# Altium footprint library JDR2812（公开）.PcbLib: 142 footprints (part 5 of 9)
Each footprint in its own frame and in the unit in brackets; x right, y up, seen from the top. Pads: shape width x height; smd on the part's side, far side on the other; paste and mask are expansions set on the pad; w line width, h text height; cw(c..) or ccw(c..) is an arc to the next point about the centre after c.
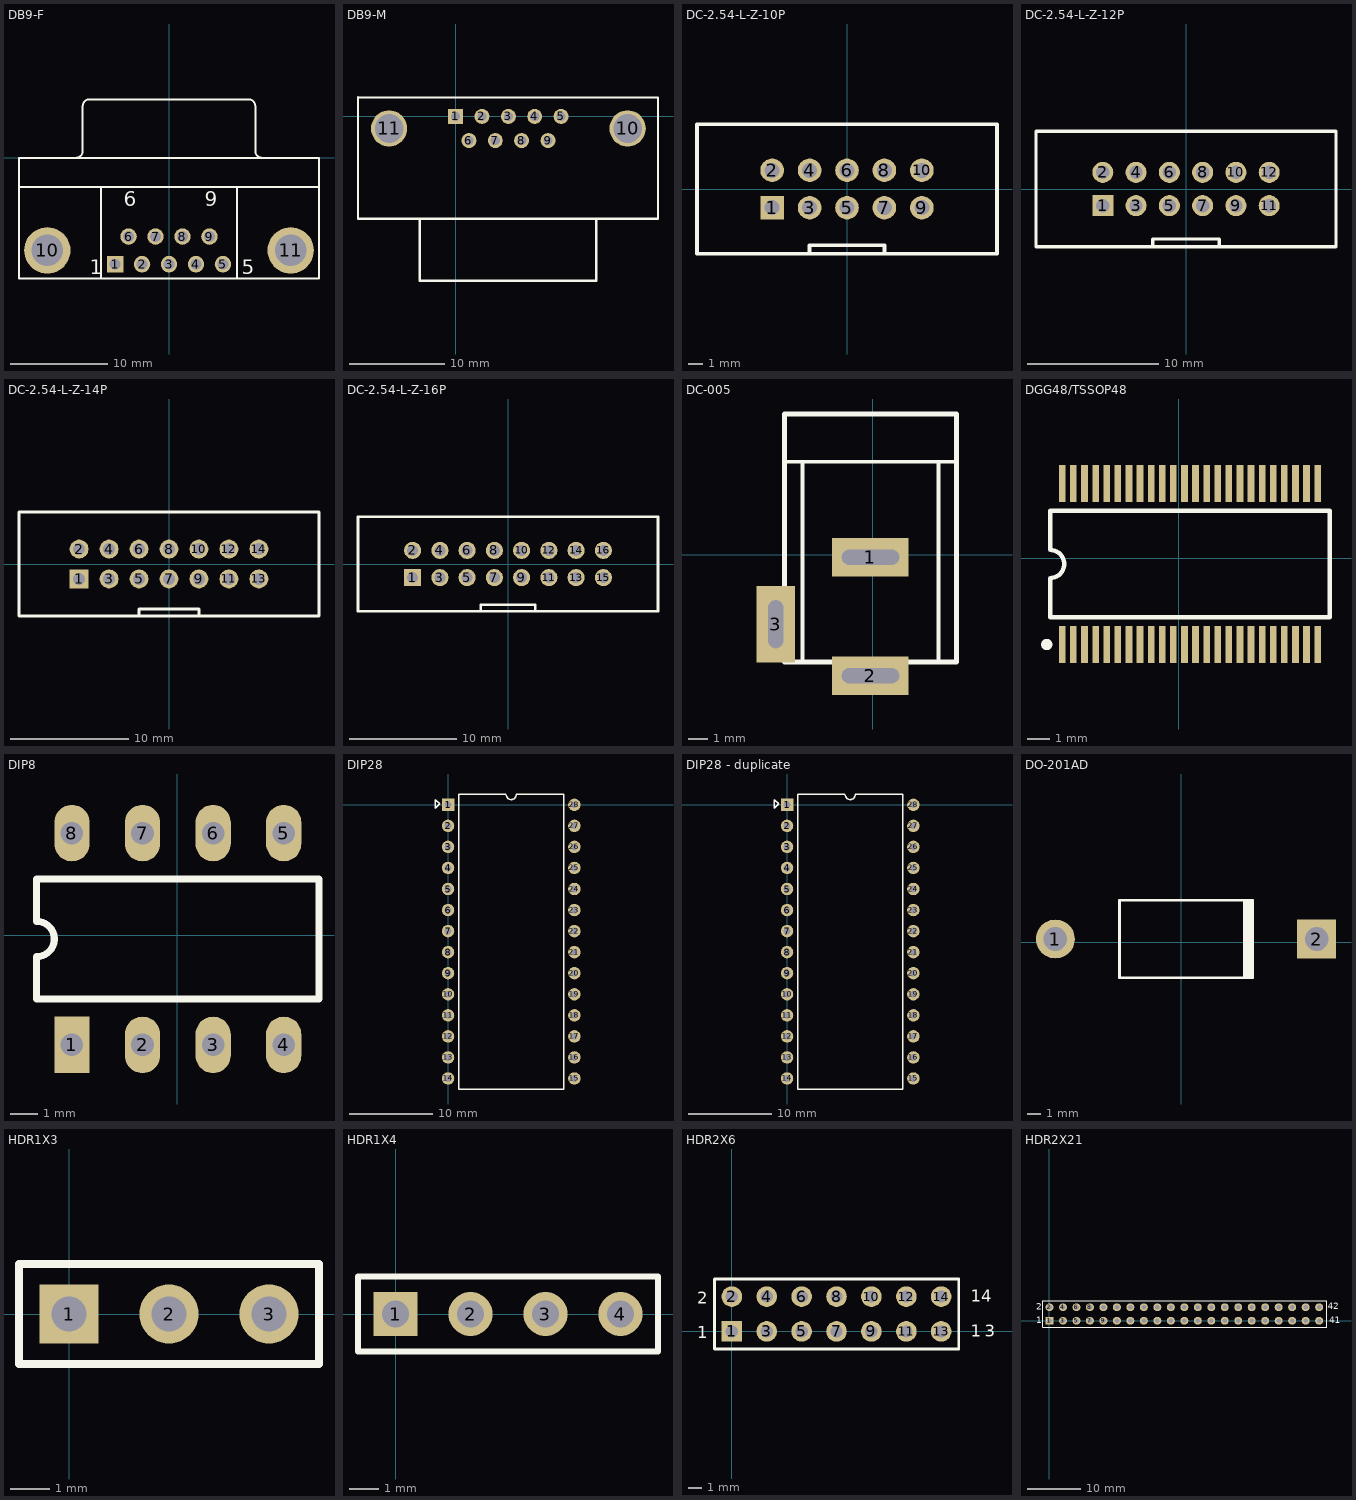
[diagram p4: the footprints below, top view; thin cyan lines are the x and y axes]

## DB9-F [mm] "DB9母座"
height 12.75
pads (11):
  rect 1.69x1.69 hole 1.09: 1(-5.54,-10.92)
  round 1.69 hole 1.09: 2(-2.77,-10.92) 3(0,-10.92) 4(2.77,-10.92) 5(5.54,-10.92) 6(-4.155,-8.08) 7(-1.385,-8.08) 8(1.385,-8.08) 9(4.155,-8.08)
  round 4.76 hole 3.26: 10(-12.495,-9.5) 11(12.495,-9.5)
Top Overlay:
  lines w0.2: -15.4,-3 15.4,-3 ; -9.56,0.005 ccw(c-9.56,0.7) -8.865,0.7 -8.865,5.3 ; -8.86,5.305 cw(c-8.165,5.305) -8.165,6 8.165,6 cw(c8.165,5.305) 8.86,5.305 ; -7,-12.4 -7,-3 ; 7,-12.4 7,-3 ; 8.865,5.3 8.865,0.7 ccw(c9.56,0.7) 9.56,0.005 ; -15.4,-12.4 -15.4,0 15.4,0 15.4,-12.4 -15.4,-12.4
  text "1" at -8.128,-11.938 h1.5
  text "5" at 7.493,-11.938 h1.5
  text "9" at 3.655,-4.975 h1.5
  text "6" at -4.655,-4.975 h1.5

## DB9-M [mil] "DB9公座"
height 393.7
pads (11):
  rect 62x62 hole 38: 1(0,0)
  round 62 hole 38: 2(109,0) 3(218,0) 4(327,0) 5(436,0) 6(55,-100) 7(164,-100) 8(273,-100) 9(382,-100)
  round 150 hole 118.11: 10(711,-50) 11(-275,-50)
Top Overlay:
  lines w8: -403.54,78.74 836.61,78.74 836.61,-423.23
  lines w10: -403.54,78.74 -403.54,-423.23 836.61,-423.23 ; -147.64,-425 -147.64,-679.13 580.71,-679.13 580.71,-425
3D body: height 314.96, standoff 0, extent -145,-680 580,-425
3D body: height 393.7, standoff 0, extent -405,-425 835,75

## DC-2.54-L-Z-10P [mm] "立式直插简牛插座，间距2.54 淘宝ID:黄晶宝石   店铺网址:https://shop463601444.taobao.com"
pads (10):
  rect 1.6x1.6 hole 1.02: 1(-5.08,-1.27)
  round 1.6 hole 1.02: 2(-5.08,1.27) 3(-2.54,-1.27) 4(-2.54,1.27) 5(0,-1.27) 6(0,1.27) 7(2.54,-1.27) 8(2.54,1.27) 9(5.08,-1.27) 10(5.08,1.27)
Top Overlay:
  lines w0.254: -2.54,-4.4 -2.54,-3.81 2.54,-3.81 2.54,-4.4 ; -10.175,-4.4 -10.175,4.4 10.175,4.4 10.175,-4.4 -10.175,-4.4
3D body "2.54ţ?": height 8.8, standoff -3.5, extent -10.175,-4.4 10.175,4.7

## DC-2.54-L-Z-12P [mm] "立式直插简牛插座，间距2.54 淘宝ID:黄晶宝石   店铺网址:https://shop463601444.taobao.com"
pads (12):
  rect 1.6x1.6 hole 1.02: 1(-6.35,-1.27)
  round 1.6 hole 1.02: 2(-6.35,1.27) 3(-3.81,-1.27) 4(-3.81,1.27) 5(-1.27,-1.27) 6(-1.27,1.27) 7(1.27,-1.27) 8(1.27,1.27) 9(3.81,-1.27) 10(3.81,1.27) 11(6.35,-1.27) 12(6.35,1.27)
Top Overlay:
  lines w0.254: -2.54,-4.4 -2.54,-3.81 2.54,-3.81 2.54,-4.4 ; -11.445,-4.4 -11.445,4.4 11.445,4.4 11.445,-4.4 -11.445,-4.4
3D body "2.54牛角?": height 8.8, standoff -3.5, extent -11.445,-4.4 11.445,4.7

## DC-2.54-L-Z-14P [mm] "立式直插简牛插座，间距2.54 淘宝ID:黄晶宝石   店铺网址:https://shop463601444.taobao.com"
pads (14):
  rect 1.6x1.6 hole 1.02: 1(-7.62,-1.27)
  round 1.6 hole 1.02: 2(-7.62,1.27) 3(-5.08,-1.27) 4(-5.08,1.27) 5(-2.54,-1.27) 6(-2.54,1.27) 7(0,-1.27) 8(0,1.27) 9(2.54,-1.27) 10(2.54,1.27) 11(5.08,-1.27) 12(5.08,1.27) 13(7.62,-1.27) 14(7.62,1.27)
Top Overlay:
  lines w0.254: -2.54,-4.4 -2.54,-3.81 2.54,-3.81 2.54,-4.4 ; -12.715,-4.4 12.715,-4.4 12.715,4.4 -12.715,4.4 -12.715,-4.4
3D body "2.54牛角?": height 8.8, standoff -3.5, extent -12.715,-4.4 12.715,4.7

## DC-2.54-L-Z-16P [mm] "立式直插简牛插座，间距2.54 淘宝ID:黄晶宝石   店铺网址:https://shop463601444.taobao.com"
pads (16):
  rect 1.6x1.6 hole 1.02: 1(-8.89,-1.27)
  round 1.6 hole 1.02: 2(-8.89,1.27) 3(-6.35,-1.27) 4(-6.35,1.27) 5(-3.81,-1.27) 6(-3.81,1.27) 7(-1.27,-1.27) 8(-1.27,1.27) 9(1.27,-1.27) 10(1.27,1.27) 11(3.81,-1.27) 12(3.81,1.27) 13(6.35,-1.27) 14(6.35,1.27) 15(8.89,-1.27) 16(8.89,1.27)
Top Overlay:
  lines w0.254: -2.54,-4.4 -2.54,-3.81 2.54,-3.81 2.54,-4.4 ; -13.985,-4.4 -13.985,4.4 13.985,4.4 13.985,-4.4 -13.985,-4.4
3D body "2.54牛角?": height 8.8, standoff -3.5, extent -13.985,-4.4 13.985,4.7

## DC-005 [mm] "5.5*2.1mm，DC30V,2.5A      淘宝ID:黄晶宝石"
pads (3):
  rect 4x2 hole 0.8 slot 3 at 0 deg: 1(-0.127,-0.127) 2(-0.127,-6.327)
  rect 2x4 hole 0.8 slot 2.5 at 90 deg: 3(-5.081,-3.627)
Top Overlay:
  lines w0.2: -4.627,4.873 4.373,4.873 ; -3.683,-5.611 -3.683,4.873 ; 3.429,-5.611 3.429,4.873
  lines w0.254: -4.627,-5.611 4.373,-5.611 4.373,7.373 -4.627,7.373 -4.627,-5.611
3D body "dc-005.STEP": height 11.2, standoff -3.8, extent -5.334,-6.644 3.966,7.406

## DGG48/TSSOP48 [mm]
pads (48):
  rect 0.3x1.65 smd: 1(-5.242,-3.879) 2(-4.742,-3.879) 3(-4.242,-3.879) 4(-3.742,-3.879) 5(-3.242,-3.879) 6(-2.742,-3.879) 7(-2.242,-3.879) 8(-1.742,-3.879) 9(-1.242,-3.879) 10(-0.742,-3.879) 11(-0.242,-3.879) 12(0.258,-3.879) 13(0.758,-3.879) 14(1.258,-3.879) 15(1.758,-3.879) 16(2.258,-3.879) 17(2.758,-3.879) 18(3.258,-3.879) 19(3.758,-3.879) 20(4.258,-3.879) 21(4.758,-3.879) 22(5.258,-3.879) 23(5.758,-3.879) 24(6.258,-3.879) 25(6.258,3.371) 26(5.758,3.371) 27(5.258,3.371) 28(4.758,3.371) 29(4.258,3.371) 30(3.758,3.371) 31(3.258,3.371) 32(2.758,3.371) 33(2.258,3.371) 34(1.758,3.371) 35(1.258,3.371) 36(0.758,3.371) 37(0.258,3.371) 38(-0.242,3.371) 39(-0.742,3.371) 40(-1.242,3.371) 41(-1.742,3.371) 42(-2.242,3.371) 43(-2.742,3.371) 44(-3.242,3.371) 45(-3.742,3.371) 46(-4.242,3.371) 47(-4.742,3.371) 48(-5.242,3.371)
Top Overlay:
  circle w0.25: c-5.942,-3.879 r0.125
  lines w0.2: -5.792,-2.654 6.808,-2.654 6.808,2.146 -5.792,2.146 -5.792,0.381 cw(c-5.792,-0.254) -5.792,-0.889 -5.792,-2.654

## DIP8 [mil]
pads (8):
  rect 50x80 hole 32: 1(-149,-155)
  oval 50x80 hole 32: 2(-49,-155) 3(51,-155) 4(151,-155) 5(151,145) 6(51,145) 7(-49,145) 8(-149,145)
Top Overlay:
  lines w10: -199,-90 201,-90 201,80 -199,80 -199,20 cw(c-199,-5) -199,-30 -199,-90

## DIP28 [mm]
pads (28):
  rect 1.5x1.5 hole 0.813: 1(0,0)
  round 1.5 hole 0.813: 2(0,-2.54) 3(0,-5.08) 4(0,-7.62) 5(0,-10.16) 6(0,-12.7) 7(0,-15.24) 8(0,-17.78) 9(0,-20.32) 10(0,-22.86) 11(0,-25.4) 12(0,-27.94) 13(0,-30.48) 14(0,-33.02) 15(15.24,-33.02) 16(15.24,-30.48) 17(15.24,-27.94) 18(15.24,-25.4) 19(15.24,-22.86) 20(15.24,-20.32) 21(15.24,-17.78) 22(15.24,-15.24) 23(15.24,-12.7) 24(15.24,-10.16) 25(15.24,-7.62) 26(15.24,-5.08) 27(15.24,-2.54) 28(15.24,0)
Top Overlay:
  lines w0.178: -1.524,-0.395 -1.016,0.113 -1.524,0.621 -1.524,-0.395 ; 1.27,-34.29 13.97,-34.29 13.97,1.27 8.255,1.27 cw(c7.62,1.27) 6.985,1.27 1.27,1.27 1.27,-34.29

## DIP28 - duplicate [mm]
pads (28):
  rect 1.5x1.5 hole 0.813: 1(0,0)
  round 1.5 hole 0.813: 2(0,-2.54) 3(0,-5.08) 4(0,-7.62) 5(0,-10.16) 6(0,-12.7) 7(0,-15.24) 8(0,-17.78) 9(0,-20.32) 10(0,-22.86) 11(0,-25.4) 12(0,-27.94) 13(0,-30.48) 14(0,-33.02) 15(15.24,-33.02) 16(15.24,-30.48) 17(15.24,-27.94) 18(15.24,-25.4) 19(15.24,-22.86) 20(15.24,-20.32) 21(15.24,-17.78) 22(15.24,-15.24) 23(15.24,-12.7) 24(15.24,-10.16) 25(15.24,-7.62) 26(15.24,-5.08) 27(15.24,-2.54) 28(15.24,0)
Top Overlay:
  lines w0.178: -1.524,-0.395 -1.016,0.113 -1.524,0.621 -1.524,-0.395 ; 1.27,-34.29 13.97,-34.29 13.97,1.27 8.255,1.27 cw(c7.62,1.27) 6.985,1.27 1.27,1.27 1.27,-34.29

## DO-201AD [mm]
pads (2):
  round 2.8 hole 1.7: 1(-9.064,0.229)
  rect 2.8x2.8 hole 1.7: 2(9.776,0.229)
Top Overlay:
  rectangle: 4.456,-2.571 5.256,3.029
  lines w0.2: 5.156,-2.571 -4.444,-2.571 -4.444,3.029 5.156,3.029

## HDR1X3 [mm] "Connector; Header; 3 Position"
pads (3):
  rect 1.5x1.5 hole 0.9: 1(0,0)
  round 1.5 hole 0.9: 2(2.54,0) 3(5.08,0)
Top Overlay:
  lines w0.2: -1.27,-1.27 6.35,-1.27 6.35,1.27 -1.27,1.27 -1.27,-1.27

## HDR1X4 [mm]
pads (4):
  rect 1.5x1.5 hole 0.9: 1(0,0)
  round 1.5 hole 0.9: 2(2.54,0) 3(5.08,0) 4(7.62,0)
Top Overlay:
  lines w0.2: -1.27,-1.27 8.89,-1.27 8.89,1.27 -1.27,1.27 -1.27,-1.27

## HDR2X6 [mm] "Connector; Header; 6x2 Position"
pads (14):
  rect 1.5x1.5 hole 0.9: 1(0,0)
  round 1.5 hole 0.9: 2(0,2.54) 3(2.54,0) 4(2.54,2.54) 5(5.08,0) 6(5.08,2.54) 7(7.62,0) 8(7.62,2.54) 9(10.16,0) 10(10.16,2.54) 11(12.7,0) 12(12.7,2.54) 13(15.24,0) 14(15.24,2.54)
Top Overlay:
  lines w0.2: -1.27,-1.27 16.51,-1.27 16.51,3.81 -1.27,3.81 -1.27,-1.27
  text "14" at 17.399,2.159 h0.89
  text "3" at 18.415,-0.381 h0.89
  text "1" at 17.399,-0.381 h0.89
  text "1" at -2.54,-0.508 h0.89
  text "2" at -2.54,2.032 h0.89

## HDR2X21 [mm] "Connector; Header; 22x2 Position"
pads (42):
  rect 1.5x1.5 hole 0.9: 1(0,0)
  round 1.5 hole 0.9: 2(0,2.54) 3(2.54,0) 4(2.54,2.54) 5(5.08,0) 6(5.08,2.54) 7(7.62,0) 8(7.62,2.54) 9(10.16,0) 10(10.16,2.54) 11(12.7,0) 12(12.7,2.54) 13(15.24,0) 14(15.24,2.54) 15(17.78,0) 16(17.78,2.54) 17(20.32,0) 18(20.32,2.54) 19(22.86,0) 20(22.86,2.54) 21(25.4,0) 22(25.4,2.54) 23(27.94,0) 24(27.94,2.54) 25(30.48,0) 26(30.48,2.54) 27(33.02,0) 28(33.02,2.54) 29(35.56,0) 30(35.56,2.54) 31(38.1,0) 32(38.1,2.54) 33(40.64,0) 34(40.64,2.54) 35(43.18,0) 36(43.18,2.54) 37(45.72,0) 38(45.72,2.54) 39(48.26,0) 40(48.26,2.54) 41(50.8,0) 42(50.8,2.54)
Top Overlay:
  lines w0.2: -1.27,-1.27 -1.27,3.81 52.197,3.81 52.197,-1.27 -1.27,-1.27
  text "41" at 52.705,-0.508 h1.27
  text "42" at 52.451,2.159 h1.27
  text "1" at -2.54,-0.508 h1.27
  text "2" at -2.54,2.032 h1.27